# Altium footprint library ICs And Semiconductors THD.PcbLib: 507 footprints (part 28 of 32)
Each footprint in its own frame and in the unit in brackets; x right, y up, seen from the top. Pads: shape width x height; smd on the part's side, far side on the other; paste and mask are expansions set on the pad; w line width, h text height; cw(c..) or ccw(c..) is an arc to the next point about the centre after c.
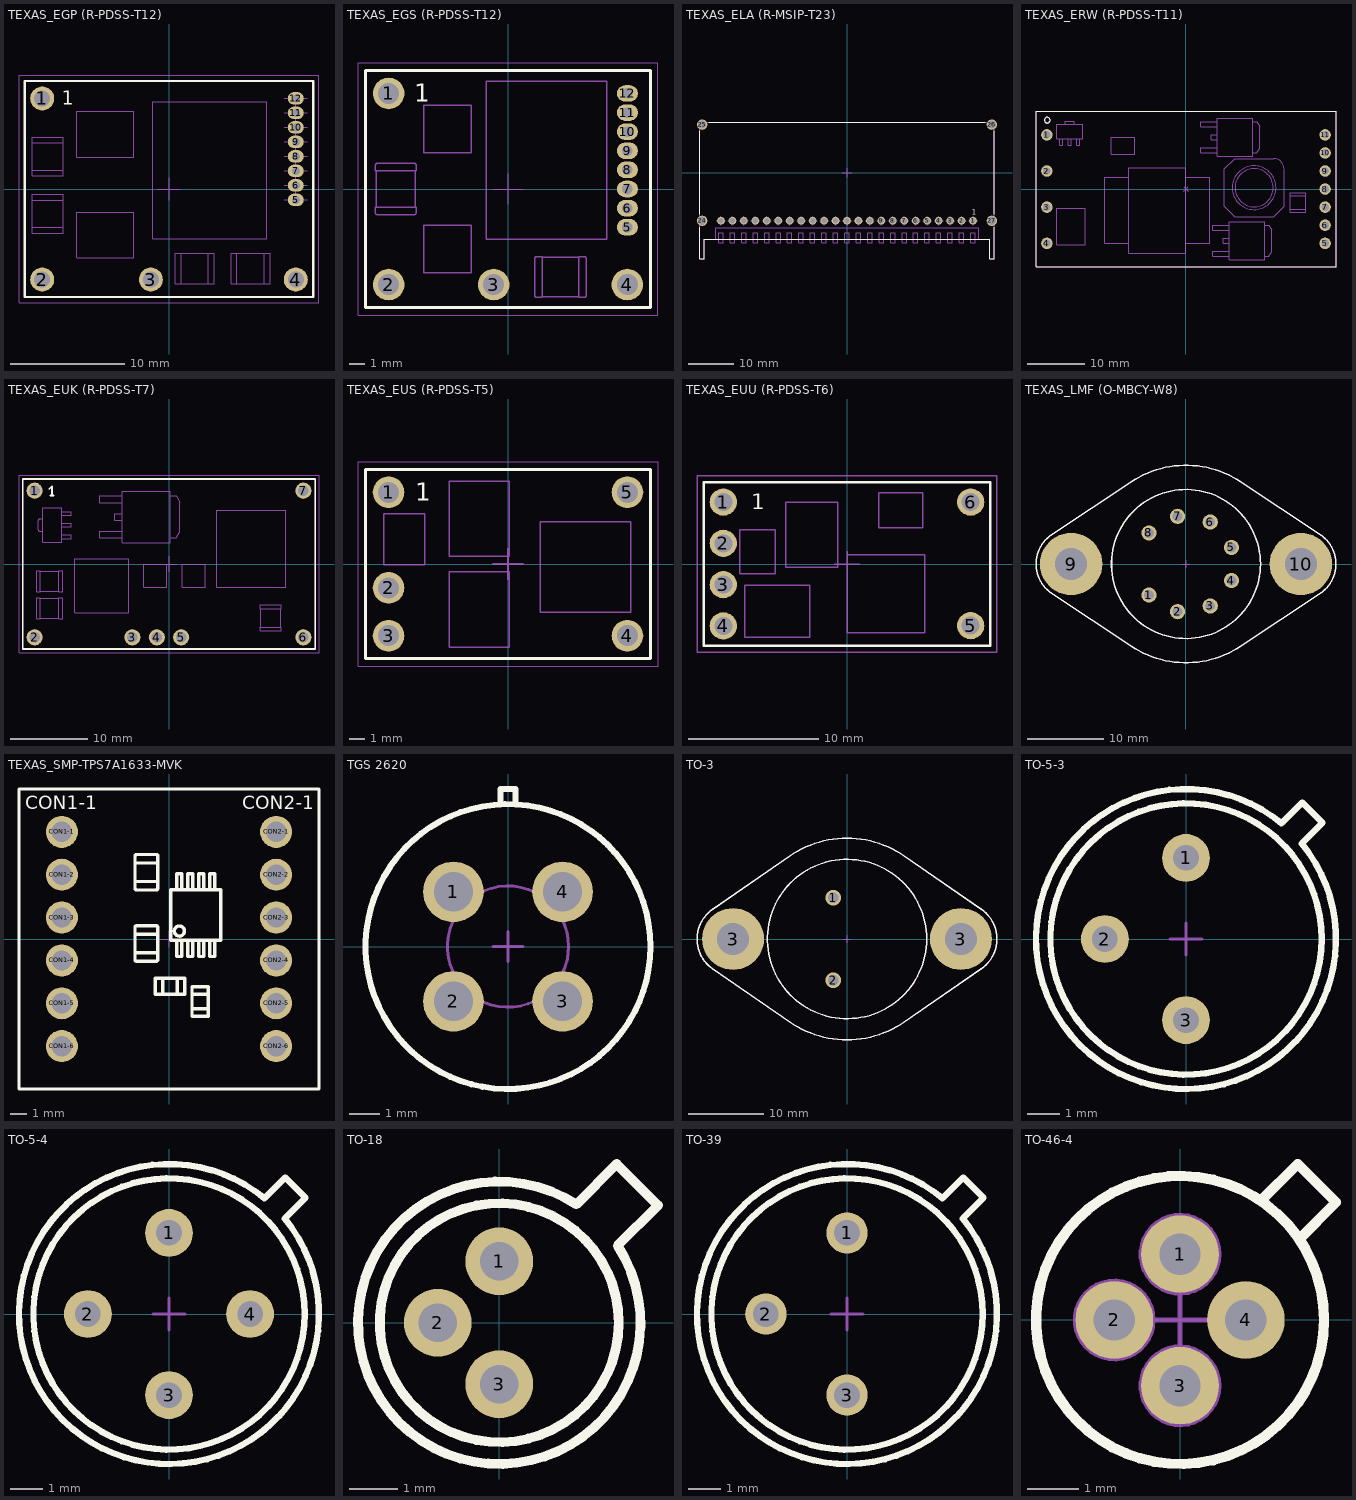
[diagram p27: the footprints below, top view; thin cyan lines are the x and y axes]

## TEXAS_EGP (R-PDSS-T12) [mm] "Texas EGP (R-PDSS-T12) Case"
height 9.65
pads (12):
  round 2.1 hole 1.4: 1(-11.11,7.94) 2(-11.11,-7.94) 3(-1.59,-7.94) 4(11.11,-7.94)
  oval 1.4x1.1 hole 0.7: 5(11.11,-0.95) 6(11.11,0.32) 7(11.11,1.59) 8(11.11,2.86) 9(11.11,4.13) 10(11.11,5.4) 11(11.11,6.67) 12(11.11,7.94)
Top Overlay:
  lines w0.2: -12.635,-9.46 -12.635,9.46 12.635,9.46 12.635,-9.46 -12.635,-9.46
  text "1" at -9.391,7.392 h1.2
Notvisible:
  lines w0.1: -12.11,-7.94 -11.11,-7.94 ; -12.11,7.94 -11.11,7.94 ; -11.11,-8.94 -11.11,-7.94 ; -11.11,-6.94 -11.11,-7.94 ; -11.11,6.94 -11.11,7.94 ; -11.11,8.94 -11.11,7.94 ; -10.11,-7.94 -11.11,-7.94 ; -10.11,7.94 -11.11,7.94 ; -2.59,-7.94 -1.59,-7.94 ; -1.59,-8.94 -1.59,-7.94 ; -1.59,-6.94 -1.59,-7.94 ; -1,0 0,0 ; -0.59,-7.94 -1.59,-7.94 ; 0,-1 0,0 ; 0,1 0,0 ; 1,0 0,0 ; 10.11,-7.94 11.11,-7.94 ; 10.11,-0.95 11.11,-0.95 ; 10.11,0.32 11.11,0.32 12.11,0.32 ; 10.11,1.59 11.11,1.59 12.11,1.59 ; 10.11,2.86 11.11,2.86 12.11,2.86 ; 10.11,4.13 11.11,4.13 12.11,4.13 ; 10.11,5.4 11.11,5.4 12.11,5.4 ; 10.11,6.67 11.11,6.67 12.11,6.67 ; 10.11,7.94 11.11,7.94 ; 11.11,-8.94 11.11,-7.94 ; 11.11,-6.94 11.11,-7.94 ; 12.11,-7.94 11.11,-7.94 ; 12.11,-0.95 11.11,-0.95 ; 12.11,7.94 11.11,7.94 ; 11.11,-0.95 11.11,7.94
Mechanical 14:
  lines w0.1: -11.987,-3.37 -9.287,-3.37 ; -11.987,-0.97 -9.287,-0.97 ; -11.987,1.648 -9.287,1.648 ; -11.987,4.048 -9.287,4.048 ; 1.053,-8.309 1.053,-5.609 ; 3.453,-8.309 3.453,-5.609 ; 5.957,-8.309 5.957,-5.609 ; 8.357,-8.309 8.357,-5.609 ; -12.635,-9.46 -12.635,9.46 12.635,9.46 12.635,-9.46 -12.635,-9.46 ; -11.987,-3.87 -11.987,-0.47 -9.287,-0.47 -9.287,-3.87 -11.987,-3.87 ; -11.987,1.148 -11.987,4.548 -9.287,4.548 -9.287,1.148 -11.987,1.148 ; -8.076,-6.046 -8.076,-2.046 -3.076,-2.046 -3.076,-6.046 -8.076,-6.046 ; -8.076,2.804 -8.076,6.804 -3.076,6.804 -3.076,2.804 -8.076,2.804 ; -1.431,-4.339 8.569,-4.339 8.569,7.661 -1.431,7.661 -1.431,-4.339 ; 0.553,-8.309 0.553,-5.609 3.953,-5.609 3.953,-8.309 0.553,-8.309 ; 5.457,-8.309 5.457,-5.609 8.857,-5.609 8.857,-8.309 5.457,-8.309
  text "1" at -9.391,7.392 h1.2
Mechanical 15:
  lines w0.1: -13.145,-9.97 13.145,-9.97 13.145,9.97 -13.145,9.97 -13.145,-9.97
3D body "TEXAS_EGP (R-PDSS-T12).stp": height 9.65, standoff -3.55, extent -12.635,-9.46 12.635,9.46

## TEXAS_EGS (R-PDSS-T12) [mm] "Texas EGS (R-PDSS-T12) Case"
height 8
pads (12):
  round 2.1 hole 1.4: 1(-7.935,6.35) 2(-7.935,-6.35) 3(-0.955,-6.35) 4(7.935,-6.35)
  oval 1.4x1.1 hole 0.7: 5(7.935,-2.54) 6(7.935,-1.27) 7(7.935,0) 8(7.935,1.27) 9(7.935,2.54) 10(7.935,3.81) 11(7.935,5.08) 12(7.935,6.35)
Top Overlay:
  lines w0.2: -9.46,-7.875 9.46,-7.875 9.46,7.875 -9.46,7.875 -9.46,-7.875
  text "1" at -6.216,5.802 h1.2
Notvisible:
  lines w0.05: -8.435,-6.35 -7.935,-6.35 ; -8.435,6.35 -7.935,6.35 ; -7.935,-6.85 -7.935,-6.35 ; -7.935,-5.85 -7.935,-6.35 ; -7.935,5.85 -7.935,6.35 ; -7.935,6.85 -7.935,6.35 ; -7.435,-6.35 -7.935,-6.35 ; -7.435,6.35 -7.935,6.35 ; -1.455,-6.35 -0.955,-6.35 ; -1,0 0,0 ; -0.955,-6.85 -0.955,-6.35 ; -0.955,-5.85 -0.955,-6.35 ; -0.455,-6.35 -0.955,-6.35 ; 0,-1 0,0 ; 0,1 0,0 ; 1,0 0,0 ; 7.435,-6.35 7.935,-6.35 ; 7.435,-2.54 7.935,-2.54 ; 7.435,-1.27 7.935,-1.27 ; 7.435,0 7.935,0 ; 7.435,1.27 7.935,1.27 ; 7.435,2.54 7.935,2.54 ; 7.435,3.81 7.935,3.81 ; 7.435,5.08 7.935,5.08 ; 7.435,6.35 7.935,6.35 ; 7.935,-6.85 7.935,-6.35 ; 7.935,-5.85 7.935,-6.35 ; 7.935,-3.04 7.935,-2.54 ; 7.935,-2.04 7.935,-2.54 ; 7.935,-1.77 7.935,-1.27 ; 7.935,-0.77 7.935,-1.27 ; 7.935,-0.5 7.935,0 ; 7.935,0.5 7.935,0 ; 7.935,0.77 7.935,1.27 ; 7.935,1.77 7.935,1.27 ; 7.935,2.04 7.935,2.54 ; 7.935,3.04 7.935,2.54 ; 7.935,3.31 7.935,3.81 ; 7.935,4.31 7.935,3.81 ; 7.935,4.58 7.935,5.08 ; 7.935,5.58 7.935,5.08 ; 7.935,5.85 7.935,6.35 ; 7.935,6.85 7.935,6.35 ; 8.435,-6.35 7.935,-6.35 ; 8.435,-2.54 7.935,-2.54 ; 8.435,-1.27 7.935,-1.27 ; 8.435,0 7.935,0 ; 8.435,1.27 7.935,1.27 ; 8.435,2.54 7.935,2.54 ; 8.435,3.81 7.935,3.81 ; 8.435,5.08 7.935,5.08 ; 8.435,6.35 7.935,6.35
Mechanical 14:
  circle w0.1: c7.935,6.35 r0.45
  circle w0.1: c7.935,5.08 r0.45
  circle w0.1: c7.935,3.81 r0.45
  circle w0.1: c7.935,2.54 r0.45
  circle w0.1: c7.935,1.27 r0.45
  circle w0.1: c7.935,0 r0.45
  circle w0.1: c7.935,-1.27 r0.45
  circle w0.1: c7.935,-2.54 r0.45
  circle w0.1: c-7.935,6.35 r0.89
  circle w0.1: c-7.935,-6.35 r0.89
  circle w0.1: c-0.955,-6.35 r0.89
  circle w0.1: c7.935,-6.35 r0.89
  lines w0.1: -8.76,-1.2 -8.76,1.2 ; -6.16,-1.2 -6.16,1.2 ; 2.29,-7.15 4.69,-7.15 ; 2.29,-4.55 4.69,-4.55 ; -9.46,-7.875 9.46,-7.875 9.46,7.875 -9.46,7.875 -9.46,-7.875 ; -8.81,-1.6 ccw(c-8.71,-1.6) -8.71,-1.7 -6.21,-1.7 ccw(c-6.21,-1.6) -6.11,-1.6 -6.11,-1.2 -8.81,-1.2 -8.81,-1.6 ; -8.81,1.2 -6.11,1.2 -6.11,1.6 ccw(c-6.21,1.6) -6.21,1.7 -8.71,1.7 ccw(c-8.71,1.6) -8.81,1.6 -8.81,1.2 ; -5.586,-5.575 -5.586,-2.425 -2.436,-2.425 -2.436,-5.575 -5.586,-5.575 ; -5.586,2.425 -5.586,5.575 -2.436,5.575 -2.436,2.425 -5.586,2.425 ; -1.431,-3.339 6.569,-3.339 6.569,7.161 -1.431,7.161 -1.431,-3.339 ; 1.79,-7.1 ccw(c1.89,-7.1) 1.89,-7.2 2.29,-7.2 2.29,-4.5 1.89,-4.5 ccw(c1.89,-4.6) 1.79,-4.6 1.79,-7.1 ; 4.69,-7.2 4.69,-4.5 5.09,-4.5 cw(c5.09,-4.6) 5.19,-4.6 5.19,-7.1 cw(c5.09,-7.1) 5.09,-7.2 4.69,-7.2 ; 7.735,-2.74 7.735,-2.34 8.135,-2.34 8.135,-2.74 7.735,-2.74 ; 7.735,-1.47 7.735,-1.07 8.135,-1.07 8.135,-1.47 7.735,-1.47 ; 7.735,-0.2 7.735,0.2 8.135,0.2 8.135,-0.2 7.735,-0.2 ; 7.735,1.07 7.735,1.47 8.135,1.47 8.135,1.07 7.735,1.07 ; 7.735,2.34 7.735,2.74 8.135,2.74 8.135,2.34 7.735,2.34 ; 7.735,3.61 7.735,4.01 8.135,4.01 8.135,3.61 7.735,3.61 ; 7.735,4.88 7.735,5.28 8.135,5.28 8.135,4.88 7.735,4.88 ; 7.735,6.15 7.735,6.55 8.135,6.55 8.135,6.15 7.735,6.15
  text "1" at -6.216,5.802 h1.2
Mechanical 15:
  lines w0.05: -9.97,-8.38 9.97,-8.38 9.97,8.38 -9.97,8.38 -9.97,-8.38
3D body "TEXAS_EGS (R-PDSS-T12).stp": height 8, standoff -3.55, extent -9.46,-7.875 9.46,7.875

## TEXAS_ELA (R-MSIP-T23) [mm] "TEXAS (R-MSIP-T23) Case"
height 12.7
pads (27):
  round 1.7 hole 1.2: 1(27.94,-10.665) 2(25.4,-10.665) 3(22.86,-10.665) 4(20.32,-10.665) 5(17.78,-10.665) 6(15.24,-10.665) 7(12.7,-10.665) 8(10.16,-10.665) 9(7.62,-10.665) 10(5.08,-10.665) 11(2.54,-10.665) 12(0,-10.665) 13(-2.54,-10.665) 14(-5.08,-10.665) 15(-7.62,-10.665) 16(-10.16,-10.665) 17(-12.7,-10.665) 18(-15.24,-10.665) 19(-17.78,-10.665) 20(-20.32,-10.665) 21(-22.86,-10.665) 22(-25.4,-10.665) 23(-27.94,-10.665)
  round 2.3 hole 1.8: 24(-32.105,-10.665) 25(-32.105,10.665) 26(32.105,10.665) 27(32.105,-10.665)
Top Overlay:
  lines w0.2: -32.605,-12.079 -32.605,-19.055 -31.605,-19.055 -31.605,-14.735 31.605,-14.735 31.605,-19.055 32.605,-19.055 32.605,-12.079 ; -32.605,-9.251 -32.605,9.251 ; -30.691,11.165 30.691,11.165 ; 32.605,-9.251 32.605,9.251
  text "1" at 27.684,-9.323 h1.2
Notvisible:
  lines w0.1: -33.105,-10.665 -32.105,-10.665 ; -33.105,10.665 -32.105,10.665 ; -32.105,-11.665 -32.105,-10.665 ; -32.105,-9.665 -32.105,-10.665 ; -32.105,9.665 -32.105,10.665 ; -32.105,11.665 -32.105,10.665 ; -31.105,-10.665 -32.105,-10.665 ; -31.105,10.665 -32.105,10.665 ; -28.94,-10.665 -27.94,-10.665 ; -27.94,-11.665 -27.94,-10.665 ; -27.94,-9.665 -27.94,-10.665 ; -26.94,-10.665 -27.94,-10.665 ; -26.4,-10.665 -25.4,-10.665 ; -25.4,-11.665 -25.4,-10.665 ; -25.4,-9.665 -25.4,-10.665 ; -24.4,-10.665 -25.4,-10.665 ; -23.86,-10.665 -22.86,-10.665 ; -22.86,-11.665 -22.86,-10.665 ; -22.86,-9.665 -22.86,-10.665 ; -21.86,-10.665 -22.86,-10.665 ; -21.32,-10.665 -20.32,-10.665 ; -20.32,-11.665 -20.32,-10.665 ; -20.32,-9.665 -20.32,-10.665 ; -19.32,-10.665 -20.32,-10.665 ; -18.78,-10.665 -17.78,-10.665 ; -17.78,-11.665 -17.78,-10.665 ; -17.78,-9.665 -17.78,-10.665 ; -16.78,-10.665 -17.78,-10.665 ; -16.24,-10.665 -15.24,-10.665 ; -15.24,-11.665 -15.24,-10.665 ; -15.24,-9.665 -15.24,-10.665 ; -14.24,-10.665 -15.24,-10.665 ; -13.7,-10.665 -12.7,-10.665 ; -12.7,-11.665 -12.7,-10.665 ; -12.7,-9.665 -12.7,-10.665 ; -11.7,-10.665 -12.7,-10.665 ; -11.16,-10.665 -10.16,-10.665 ; -10.16,-11.665 -10.16,-10.665 ; -10.16,-9.665 -10.16,-10.665 ; -9.16,-10.665 -10.16,-10.665 ; -8.62,-10.665 -7.62,-10.665 ; -7.62,-11.665 -7.62,-10.665 ; -7.62,-9.665 -7.62,-10.665 ; -6.62,-10.665 -7.62,-10.665 ; -6.08,-10.665 -5.08,-10.665 ; -5.08,-11.665 -5.08,-10.665 ; -5.08,-9.665 -5.08,-10.665 ; -4.08,-10.665 -5.08,-10.665 ; -3.54,-10.665 -2.54,-10.665 ; -2.54,-11.665 -2.54,-10.665 ; -2.54,-9.665 -2.54,-10.665 ; -1.54,-10.665 -2.54,-10.665 ; -1,-10.665 0,-10.665 ; -1,0 0,0 ; 0,-11.665 0,-10.665 ; 0,-9.665 0,-10.665 ; 0,-1 0,0 ; 0,1 0,0 ; 1,-10.665 0,-10.665 ; 1,0 0,0 ; 1.54,-10.665 2.54,-10.665 ; 2.54,-11.665 2.54,-10.665 ; 2.54,-9.665 2.54,-10.665 ; 3.54,-10.665 2.54,-10.665 ; 4.08,-10.665 5.08,-10.665 ; 5.08,-11.665 5.08,-10.665 ; 5.08,-9.665 5.08,-10.665 ; 6.08,-10.665 5.08,-10.665 ; 6.62,-10.665 7.62,-10.665 ; 7.62,-11.665 7.62,-10.665 ; 7.62,-9.665 7.62,-10.665 ; 8.62,-10.665 7.62,-10.665 ; 9.16,-10.665 10.16,-10.665 ; 10.16,-11.665 10.16,-10.665 ; 10.16,-9.665 10.16,-10.665 ; 11.16,-10.665 10.16,-10.665 ; 11.7,-10.665 12.7,-10.665 ; 12.7,-11.665 12.7,-10.665 ; 12.7,-9.665 12.7,-10.665 ; 13.7,-10.665 12.7,-10.665 ; 14.24,-10.665 15.24,-10.665 ; 15.24,-11.665 15.24,-10.665 ; 15.24,-9.665 15.24,-10.665 ; 16.24,-10.665 15.24,-10.665 ; 16.78,-10.665 17.78,-10.665 ; 17.78,-11.665 17.78,-10.665 ; 17.78,-9.665 17.78,-10.665 ; 18.78,-10.665 17.78,-10.665 ; 19.32,-10.665 20.32,-10.665 ; 20.32,-11.665 20.32,-10.665 ; 20.32,-9.665 20.32,-10.665 ; 21.32,-10.665 20.32,-10.665 ; 21.86,-10.665 22.86,-10.665 ; 22.86,-11.665 22.86,-10.665 ; 22.86,-9.665 22.86,-10.665 ; 23.86,-10.665 22.86,-10.665 ; 24.4,-10.665 25.4,-10.665 ; 25.4,-11.665 25.4,-10.665 ; 25.4,-9.665 25.4,-10.665 ; 26.4,-10.665 25.4,-10.665 ; 26.94,-10.665 27.94,-10.665 ; 27.94,-11.665 27.94,-10.665 ; 27.94,-9.665 27.94,-10.665 ; 28.94,-10.665 27.94,-10.665 ; 31.105,-10.665 32.105,-10.665 ; 31.105,10.665 32.105,10.665 ; 32.105,-11.665 32.105,-10.665 ; 32.105,-9.665 32.105,-10.665 ; 32.105,9.665 32.105,10.665 ; 32.105,11.665 32.105,10.665 ; 33.105,-10.665 32.105,-10.665 ; 33.105,10.665 32.105,10.665
Mechanical 14:
  lines w0.1: -29.105,-14.735 -29.105,-12.235 29.105,-12.235 29.105,-14.735 ; -28.44,-14.735 -31.605,-14.735 -31.605,-19.055 -32.605,-19.055 -32.605,11.165 32.605,11.165 32.605,-19.055 31.605,-19.055 31.605,-14.735 28.44,-14.735 ; -27.44,-14.735 -25.9,-14.735 ; -24.9,-14.735 -23.36,-14.735 ; -22.36,-14.735 -20.82,-14.735 ; -19.82,-14.735 -18.28,-14.735 ; -17.28,-14.735 -15.74,-14.735 ; -14.74,-14.735 -13.2,-14.735 ; -12.2,-14.735 -10.66,-14.735 ; -9.66,-14.735 -8.12,-14.735 ; -7.12,-14.735 -5.58,-14.735 ; -4.58,-14.735 -3.04,-14.735 ; -2.04,-14.735 -0.5,-14.735 ; 0.5,-14.735 2.04,-14.735 ; 3.04,-14.735 4.58,-14.735 ; 5.58,-14.735 7.12,-14.735 ; 8.12,-14.735 9.66,-14.735 ; 10.66,-14.735 12.2,-14.735 ; 13.2,-14.735 14.74,-14.735 ; 15.74,-14.735 17.28,-14.735 ; 18.28,-14.735 19.82,-14.735 ; 20.82,-14.735 22.36,-14.735 ; 23.36,-14.735 24.9,-14.735 ; 25.9,-14.735 27.44,-14.735 ; -28.44,-15.535 -28.44,-13.331 -27.44,-13.331 -27.44,-15.535 -28.44,-15.535 ; -25.9,-15.535 -25.9,-13.331 -24.9,-13.331 -24.9,-15.535 -25.9,-15.535 ; -23.36,-15.535 -23.36,-13.331 -22.36,-13.331 -22.36,-15.535 -23.36,-15.535 ; -20.82,-15.535 -20.82,-13.331 -19.82,-13.331 -19.82,-15.535 -20.82,-15.535 ; -18.28,-15.535 -18.28,-13.331 -17.28,-13.331 -17.28,-15.535 -18.28,-15.535 ; -15.74,-15.535 -15.74,-13.331 -14.74,-13.331 -14.74,-15.535 -15.74,-15.535 ; -13.2,-15.535 -13.2,-13.331 -12.2,-13.331 -12.2,-15.535 -13.2,-15.535 ; -10.66,-15.535 -10.66,-13.331 -9.66,-13.331 -9.66,-15.535 -10.66,-15.535 ; -8.12,-15.535 -8.12,-13.331 -7.12,-13.331 -7.12,-15.535 -8.12,-15.535 ; -5.58,-15.535 -5.58,-13.331 -4.58,-13.331 -4.58,-15.535 -5.58,-15.535 ; -3.04,-15.535 -3.04,-13.331 -2.04,-13.331 -2.04,-15.535 -3.04,-15.535 ; -0.5,-15.535 -0.5,-13.331 0.5,-13.331 0.5,-15.535 -0.5,-15.535 ; 2.04,-15.535 2.04,-13.331 3.04,-13.331 3.04,-15.535 2.04,-15.535 ; 4.58,-15.535 4.58,-13.331 5.58,-13.331 5.58,-15.535 4.58,-15.535 ; 7.12,-15.535 7.12,-13.331 8.12,-13.331 8.12,-15.535 7.12,-15.535 ; 9.66,-15.535 9.66,-13.331 10.66,-13.331 10.66,-15.535 9.66,-15.535 ; 12.2,-15.535 12.2,-13.331 13.2,-13.331 13.2,-15.535 12.2,-15.535 ; 14.74,-15.535 14.74,-13.331 15.74,-13.331 15.74,-15.535 14.74,-15.535 ; 17.28,-15.535 17.28,-13.331 18.28,-13.331 18.28,-15.535 17.28,-15.535 ; 19.82,-15.535 19.82,-13.331 20.82,-13.331 20.82,-15.535 19.82,-15.535 ; 22.36,-15.535 22.36,-13.331 23.36,-13.331 23.36,-15.535 22.36,-15.535 ; 24.9,-15.535 24.9,-13.331 25.9,-13.331 25.9,-15.535 24.9,-15.535 ; 27.44,-15.535 27.44,-13.331 28.44,-13.331 28.44,-15.535 27.44,-15.535
  text "1" at 27.684,-9.323 h1.2
3D body "TEXAS_ELA (R-MSIP-T23).stp": height 12.7, standoff -4, extent -32.605,-19.055 32.605,11.165

## TEXAS_ERW (R-PDSS-T11) [mm] "Texas ERW (R-PDSS-T11) Case, Body W 51.94 x L 26.54 x H9.98mm"
height 8.98
pads (11):
  round 2 hole 1.3: 1(-24.445,9.51) 2(-24.445,3.16) 3(-24.445,-3.19) 4(-24.445,-9.54) 5(24.445,-9.54) 6(24.445,-6.365) 7(24.445,-3.19) 8(24.445,-0.015) 9(24.445,3.16) 10(24.445,6.335) 11(24.445,9.51)
Top Overlay:
  circle w0.2: c-24.37,12.085 r0.5
  lines w0.2: -26.35,-13.65 -26.35,13.65 26.35,13.65 26.35,-13.65 -26.35,-13.65
Notvisible:
  lines w0.1: -24.945,-9.54 -24.445,-9.54 ; -24.945,-3.19 -24.445,-3.19 ; -24.945,3.16 -24.445,3.16 ; -24.945,9.51 -24.445,9.51 ; -24.445,-10.04 -24.445,-9.54 ; -24.445,-9.04 -24.445,-9.54 ; -24.445,-3.69 -24.445,-3.19 ; -24.445,-2.69 -24.445,-3.19 ; -24.445,2.66 -24.445,3.16 ; -24.445,3.66 -24.445,3.16 ; -24.445,9.01 -24.445,9.51 ; -24.445,10.01 -24.445,9.51 ; -23.945,-9.54 -24.445,-9.54 ; -23.945,-3.19 -24.445,-3.19 ; -23.945,3.16 -24.445,3.16 ; -23.945,9.51 -24.445,9.51 ; -0.354,-0.354 0,0 ; -0.354,0.354 0,0 ; 0.354,-0.354 0,0 ; 0.354,0.354 0,0 ; 23.945,-9.54 24.445,-9.54 ; 23.945,-6.365 24.445,-6.365 ; 23.945,-3.19 24.445,-3.19 ; 23.945,-0.015 24.445,-0.015 ; 23.945,3.16 24.445,3.16 ; 23.945,6.335 24.445,6.335 ; 23.945,9.51 24.445,9.51 ; 24.445,-10.04 24.445,-9.54 ; 24.445,-9.04 24.445,-9.54 ; 24.445,-6.865 24.445,-6.365 ; 24.445,-5.865 24.445,-6.365 ; 24.445,-3.69 24.445,-3.19 ; 24.445,-2.69 24.445,-3.19 ; 24.445,-0.515 24.445,-0.015 ; 24.445,0.485 24.445,-0.015 ; 24.445,2.66 24.445,3.16 ; 24.445,3.66 24.445,3.16 ; 24.445,5.835 24.445,6.335 ; 24.445,6.835 24.445,6.335 ; 24.445,9.01 24.445,9.51 ; 24.445,10.01 24.445,9.51 ; 24.945,-9.54 24.445,-9.54 ; 24.945,-6.365 24.445,-6.365 ; 24.945,-3.19 24.445,-3.19 ; 24.945,-0.015 24.445,-0.015 ; 24.945,3.16 24.445,3.16 ; 24.945,6.335 24.445,6.335 ; 24.945,9.51 24.445,9.51
Mechanical 14:
  circle w0.1: c24.445,9.51 r0.85
  circle w0.1: c24.445,6.335 r0.85
  circle w0.1: c24.445,3.16 r0.85
  circle w0.1: c24.445,-0.015 r0.85
  circle w0.1: c24.445,-3.19 r0.85
  circle w0.1: c24.445,-6.365 r0.85
  circle w0.1: c24.445,-9.54 r0.85
  circle w0.1: c-24.445,-9.54 r0.85
  circle w0.1: c-24.445,-3.19 r0.85
  circle w0.1: c-24.445,3.16 r0.85
  circle w0.1: c-24.445,9.51 r0.85
  circle w0.1: c11.97,0.23 r3.85
  circle w0.1: c11.97,0.23 r3.35
  circle w0.1: c-24.37,12.085 r0.5
  lines w0.1: -22.16,8.861 -22.16,7.67 -21.68,7.67 -21.68,8.87 ; -21.22,11.35 -21.22,11.92 -19.62,11.92 -19.62,11.353 ; -20.66,8.861 -20.66,7.67 -20.18,7.67 -20.18,8.861 ; -19.16,8.87 -19.16,7.67 -18.68,7.67 -18.68,8.87 ; -10.03,-9.57 -14.23,-9.57 -14.23,2.03 -10.03,2.03 ; -0.03,-9.57 4.17,-9.57 4.17,2.03 -0.03,2.03 ; 5.47,6.38 2.564,6.38 2.564,7.27 5.47,7.27 ; 5.47,8.66 4.47,8.66 4.47,9.55 5.47,9.55 ; 5.47,10.94 2.564,10.94 2.564,11.83 5.47,11.83 ; 7.57,-11.83 4.664,-11.83 4.664,-10.94 7.57,-10.94 ; 7.57,-9.55 6.57,-9.55 6.57,-8.66 7.57,-8.66 ; 7.57,-7.27 4.664,-7.27 4.664,-6.38 7.57,-6.38 ; 11.69,6.375 12.46,6.375 12.96,7.175 12.96,11.035 12.46,11.835 11.69,11.835 ; 13.79,-11.835 14.56,-11.835 15.06,-11.035 15.06,-7.175 14.56,-6.375 13.79,-6.375 ; 18.299,-3.559 20.999,-3.559 ; 18.299,-1.159 20.999,-1.159 ; -26.35,-13.65 -26.35,13.65 26.35,13.65 26.35,-13.65 -26.35,-13.65 ; -22.67,-9.77 -22.67,-3.37 -17.67,-3.37 -17.67,-9.77 -22.67,-9.77 ; -22.67,8.87 -22.67,11.35 -18.17,11.35 -18.17,8.87 -22.67,8.87 ; -13.17,6.07 -13.17,9.07 -8.97,9.07 -8.97,6.07 -13.17,6.07 ; -10.03,-11.27 -0.03,-11.27 -0.03,3.73 -10.03,3.73 -10.03,-11.27 ; 5.47,5.74 5.47,12.47 11.69,12.47 11.69,5.74 5.47,5.74 ; 6.72,-3.07 6.72,3.53 8.52,5.33 15.42,5.33 cw(c15.42,3.53) 17.22,3.53 17.22,-3.07 15.42,-4.87 8.52,-4.87 6.72,-3.07 ; 7.57,-12.47 7.57,-5.74 13.79,-5.74 13.79,-12.47 7.57,-12.47 ; 18.299,-4.059 20.999,-4.059 20.999,-0.659 18.299,-0.659 18.299,-4.059
3D body "TEXAS_ERW (R-PDSS-T11).stp": height 9.98, standoff -3.55, extent -26.35,-13.65 26.35,13.65

## TEXAS_EUK (R-PDSS-T7) [mm] "Texas EUK (R-PDSS-T7) Case, Body W 22.1 x L 37.97 x H9mm"
height 9
pads (7):
  round 2.1 hole 1.4: 1(-17.463,9.525) 2(-17.463,-9.525) 3(-4.763,-9.525) 4(-1.587,-9.525) 5(1.587,-9.525) 6(17.463,-9.525) 7(17.463,9.525)
Top Overlay:
  lines w0.2: -15.558,9.749 -15.205,10.102 -15.205,8.902 ; -15.455,8.902 -14.955,8.902 ; -18.985,-11.049 -18.985,11.049 18.985,11.049 18.985,-11.049 -18.985,-11.049
Notvisible:
  lines w0.1: -18.463,-9.525 -17.463,-9.525 ; -18.463,9.525 -17.463,9.525 ; -17.463,-10.525 -17.463,-9.525 ; -17.463,-8.525 -17.463,-9.525 ; -17.463,8.525 -17.463,9.525 ; -17.463,10.525 -17.463,9.525 ; -16.463,-9.525 -17.463,-9.525 ; -16.463,9.525 -17.463,9.525 ; -5.763,-9.525 -4.763,-9.525 ; -4.763,-10.525 -4.763,-9.525 ; -4.763,-8.525 -4.763,-9.525 ; -3.763,-9.525 -4.763,-9.525 ; -2.588,-9.525 -1.587,-9.525 ; -1.587,-10.525 -1.587,-9.525 ; -1.587,-8.525 -1.587,-9.525 ; -1,0 0,0 ; -0.587,-9.525 -1.587,-9.525 ; 0,-1 0,0 ; 0,1 0,0 ; 0.587,-9.525 1.587,-9.525 ; 1,0 0,0 ; 1.587,-10.525 1.587,-9.525 ; 1.587,-8.525 1.587,-9.525 ; 2.588,-9.525 1.587,-9.525 ; 16.463,-9.525 17.463,-9.525 ; 16.463,9.525 17.463,9.525 ; 17.463,-10.525 17.463,-9.525 ; 17.463,-8.525 17.463,-9.525 ; 17.463,8.525 17.463,9.525 ; 17.463,10.525 17.463,9.525 ; 18.463,-9.525 17.463,-9.525 ; 18.463,9.525 17.463,9.525
Mechanical 14:
  circle w0.1: c-17.463,9.525 r0.89
  circle w0.1: c17.463,9.525 r0.89
  circle w0.1: c17.463,-9.525 r0.89
  circle w0.1: c1.587,-9.525 r0.89
  circle w0.1: c-1.587,-9.525 r0.89
  circle w0.1: c-4.763,-9.525 r0.89
  circle w0.1: c-17.463,-9.525 r0.89
  lines w0.1: -16.715,-7.05 -14.315,-7.05 ; -16.715,-4.45 -14.315,-4.45 ; -16.715,-3.55 -14.315,-3.55 ; -16.715,-0.95 -14.315,-0.95 ; -16.415,4.249 -16.785,4.249 cw(c-16.785,4.449) -16.985,4.449 -16.985,5.649 cw(c-16.785,5.649) -16.785,5.849 -16.415,5.849 ; -15.558,9.749 -15.205,10.102 -15.205,8.902 ; -15.455,8.902 -14.955,8.902 ; -13.969,5.289 -12.735,5.289 -12.735,4.809 -13.926,4.809 ; -13.935,6.309 -12.735,6.309 -12.735,6.789 -13.935,6.789 ; -13.926,3.309 -12.735,3.309 -12.735,3.789 -13.926,3.789 ; -6.079,3.391 -9.009,3.391 -9.009,4.281 -6.079,4.281 ; -6.079,5.671 -7.079,5.671 -7.079,6.561 -6.079,6.561 ; -6.079,7.951 -9.009,7.951 -9.009,8.841 -6.079,8.841 ; 0.141,3.386 0.911,3.386 1.411,4.186 1.411,8.046 0.911,8.846 0.141,8.846 ; 11.935,-8.2 11.935,-5.8 ; 14.535,-8.2 14.535,-5.8 ; -18.985,-11.049 -18.985,11.049 18.985,11.049 18.985,-11.049 -18.985,-11.049 ; -17.215,-7.1 -16.715,-7.1 -16.715,-4.4 -17.215,-4.4 -17.215,-7.1 ; -17.215,-3.6 -16.715,-3.6 -16.715,-0.9 -17.215,-0.9 -17.215,-3.6 ; -16.415,2.799 -16.415,7.299 -13.935,7.299 -13.935,2.799 -16.415,2.799 ; -14.315,-7.1 -13.815,-7.1 -13.815,-4.4 -14.315,-4.4 -14.315,-7.1 ; -14.315,-3.6 -13.815,-3.6 -13.815,-0.9 -14.315,-0.9 -14.315,-3.6 ; -12.246,-6.335 -12.246,0.665 -5.246,0.665 -5.246,-6.335 -12.246,-6.335 ; -6.079,2.751 0.141,2.751 0.141,9.481 -6.079,9.481 -6.079,2.751 ; -3.31,-3 -3.31,0 -0.31,0 -0.31,-3 -3.31,-3 ; 1.69,-3 1.69,0 4.69,0 4.69,-3 1.69,-3 ; 6.185,-3 6.185,7 15.185,7 15.185,-3 6.185,-3 ; 11.885,-8.7 14.585,-8.7 14.585,-8.2 11.885,-8.2 11.885,-8.7 ; 11.885,-5.8 11.885,-5.3 14.585,-5.3 14.585,-5.8 11.885,-5.8
Mechanical 15:
  lines w0.05: -19.495,-11.555 -19.495,11.555 19.495,11.555 19.495,-11.555 -19.495,-11.555
3D body "TEXAS_EUK (R-PDSS-T7).stp": height 8.97, standoff -3.55, extent -18.985,-11.049 18.985,11.049

## TEXAS_EUS (R-PDSS-T5) [mm] "Texas EUS (R-PDSS-T5) Case"
height 8.5
pads (5):
  round 2.1 hole 1.4: 1(-7.94,4.765) 2(-7.94,-1.585) 3(-7.94,-4.765) 4(7.94,-4.765) 5(7.94,4.765)
Top Overlay:
  lines w0.2: -9.46,-6.285 9.46,-6.285 9.46,6.285 -9.46,6.285 -9.46,-6.285
  text "1" at -6.166,4.217 h1.2
Notvisible:
  lines w0.1: -8.94,-4.765 -7.94,-4.765 ; -8.94,-1.585 -7.94,-1.585 ; -8.94,4.765 -7.94,4.765 ; -7.94,-5.765 -7.94,-4.765 ; -7.94,-3.765 -7.94,-4.765 ; -7.94,-2.585 -7.94,-1.585 ; -7.94,-0.585 -7.94,-1.585 ; -7.94,3.765 -7.94,4.765 ; -7.94,5.765 -7.94,4.765 ; -6.94,-4.765 -7.94,-4.765 ; -6.94,-1.585 -7.94,-1.585 ; -6.94,4.765 -7.94,4.765 ; -1,0 0,0 ; 0,-1 0,0 ; 0,1 0,0 ; 1,0 0,0 ; 6.94,-4.765 7.94,-4.765 ; 6.94,4.765 7.94,4.765 ; 7.94,-5.765 7.94,-4.765 ; 7.94,-3.765 7.94,-4.765 ; 7.94,3.765 7.94,4.765 ; 7.94,5.765 7.94,4.765 ; 8.94,-4.765 7.94,-4.765 ; 8.94,4.765 7.94,4.765
Mechanical 14:
  lines w0.1: -9.46,-6.285 -9.46,6.285 9.46,6.285 9.46,-6.285 -9.46,-6.285 ; -8.247,-0.059 -8.247,3.341 -5.547,3.341 -5.547,-0.059 -8.247,-0.059 ; -3.912,-5.523 -3.912,-0.523 0.088,-0.523 0.088,-5.523 -3.912,-5.523 ; -3.912,0.502 -3.912,5.502 0.088,5.502 0.088,0.502 -3.912,0.502 ; 2.154,-3.194 2.154,2.806 8.154,2.806 8.154,-3.194 2.154,-3.194
  text "1" at -6.166,4.217 h1.2
Mechanical 15:
  lines w0.05: -9.97,-6.795 -9.97,6.795 9.97,6.795 9.97,-6.795 -9.97,-6.795
3D body "TEXAS_EUS (R-PDSS-T5).stp": height 8.5, standoff -3.55, extent -9.46,-6.285 9.46,6.285

## TEXAS_EUU (R-PDSS-T6) [mm] "Texas TEXAS_EUU (R-PDSS-T6) Case"
height 8.5
pads (6):
  round 2.1 hole 1.4: 1(-9.53,4.77) 2(-9.53,1.59) 3(-9.53,-1.59) 4(-9.53,-4.77) 5(9.53,-4.75) 6(9.53,4.77)
Top Overlay:
  lines w0.2: -11.05,-6.285 -11.05,6.285 11.05,6.285 11.05,-6.285 -11.05,-6.285
  text "1" at -7.366,4.202 h1.2
Notvisible:
  lines w0.1: -10.53,-4.77 -9.53,-4.77 ; -10.53,-1.59 -9.53,-1.59 ; -10.53,1.59 -9.53,1.59 ; -10.53,4.77 -9.53,4.77 ; -9.53,-5.77 -9.53,-4.77 ; -9.53,-3.77 -9.53,-4.77 ; -9.53,-2.59 -9.53,-1.59 ; -9.53,-0.59 -9.53,-1.59 ; -9.53,0.59 -9.53,1.59 ; -9.53,2.59 -9.53,1.59 ; -9.53,3.77 -9.53,4.77 ; -9.53,5.77 -9.53,4.77 ; -8.53,-4.77 -9.53,-4.77 ; -8.53,-1.59 -9.53,-1.59 ; -8.53,1.59 -9.53,1.59 ; -8.53,4.77 -9.53,4.77 ; -1,0 0,0 ; 0,-1 0,0 ; 0,1 0,0 ; 1,0 0,0 ; 8.53,-4.75 9.53,-4.75 ; 8.53,4.77 9.53,4.77 ; 9.53,-5.75 9.53,-4.75 ; 9.53,-3.75 9.53,-4.75 ; 9.53,3.77 9.53,4.77 ; 9.53,5.77 9.53,4.77 ; 10.53,-4.75 9.53,-4.75 ; 10.53,4.77 9.53,4.77
Mechanical 14:
  lines w0.1: -11.05,-6.285 -11.05,6.285 11.05,6.285 11.05,-6.285 -11.05,-6.285 ; -8.247,-0.77 -5.547,-0.77 -5.547,2.63 -8.247,2.63 -8.247,-0.77 ; -7.867,-5.631 -2.867,-5.631 -2.867,-1.631 -7.867,-1.631 -7.867,-5.631 ; -4.715,-0.254 -0.715,-0.254 -0.715,4.746 -4.715,4.746 -4.715,-0.254 ; 0,-5.285 6,-5.285 6,0.715 0,0.715 0,-5.285 ; 2.45,2.799 2.45,5.499 5.85,5.499 5.85,2.799 2.45,2.799
  text "1" at -7.366,4.202 h1.2
Mechanical 15:
  lines w0.1: -11.56,-6.795 -11.56,6.795 11.56,6.795 11.56,-6.795 -11.56,-6.795
3D body "TEXAS_EUU (R-PDSS-T6).stp": height 8.5, standoff -3.55, extent -11.05,-6.285 11.05,6.285

## TEXAS_LMF (O-MBCY-W8) [mm] "TO-3 8 Pins, Texas LMF (O-MBCY-W8) Case"
height 7.62
pads (10):
  round 2 hole 1.3: 1(-4.864,-4.082) 2(-1.103,-6.254) 3(3.175,-5.499) 4(5.967,-2.172) 5(5.967,2.172) 6(3.175,5.499) 7(-1.103,6.254) 8(-4.864,4.082)
  round 8.2 hole 4.2: 9(-15.075,0) 10(15.075,0)
Top Overlay:
  circle w0.2: c0,0 r9.78
  lines w0.2: -17.627,-3.839 cw(c-15.075,0) -17.627,3.839 -7.171,10.789 cw(c0,0) 7.171,10.789 17.627,3.839 cw(c15.075,0) 17.627,-3.839 7.171,-10.789 cw(c0,0) -7.171,-10.789 -17.627,-3.839
Notvisible:
  lines w0.1: -15.575,0 -15.075,0 ; -15.075,-0.5 -15.075,0 ; -15.075,0.5 -15.075,0 ; -14.575,0 -15.075,0 ; -5.247,-4.403 -4.864,-4.082 ; -5.247,4.403 -4.864,4.082 ; -5.186,-3.699 -4.864,-4.082 ; -5.186,3.699 -4.864,4.082 ; -4.543,-4.465 -4.864,-4.082 ; -4.543,4.465 -4.864,4.082 ; -4.481,-3.76 -4.864,-4.082 ; -4.481,3.76 -4.864,4.082 ; -1.595,-6.167 -1.103,-6.254 ; -1.595,6.167 -1.103,6.254 ; -1.189,-6.746 -1.103,-6.254 ; -1.189,6.746 -1.103,6.254 ; -1.016,-5.761 -1.103,-6.254 ; -1.016,5.761 -1.103,6.254 ; -0.61,-6.34 -1.103,-6.254 ; -0.61,6.34 -1.103,6.254 ; -0.5,0 0,0 ; 0,-0.5 0,0 ; 0,0.5 0,0 ; 0.5,0 0,0 ; 2.742,-5.749 3.175,-5.499 ; 2.742,5.749 3.175,5.499 ; 2.925,-5.066 3.175,-5.499 ; 2.925,5.066 3.175,5.499 ; 3.425,-5.932 3.175,-5.499 ; 3.425,5.932 3.175,5.499 ; 3.608,-5.249 3.175,-5.499 ; 3.608,5.249 3.175,5.499 ; 5.497,-2.001 5.967,-2.172 ; 5.497,2.001 5.967,2.172 ; 5.796,-2.642 5.967,-2.172 ; 5.796,2.642 5.967,2.172 ; 6.138,-1.702 5.967,-2.172 ; 6.138,1.702 5.967,2.172 ; 6.437,-2.343 5.967,-2.172 ; 6.437,2.343 5.967,2.172 ; 14.575,0 15.075,0 ; 15.075,-0.5 15.075,0 ; 15.075,0.5 15.075,0 ; 15.575,0 15.075,0
Mechanical 14:
  circle w0.1: c-15.075,0 r1.95
  circle w0.1: c15.075,0 r1.95
  circle w0.1: c0,0 r9.78
  lines w0.1: -17.627,-3.839 cw(c-15.075,0) -17.627,3.839 -7.171,10.789 cw(c0,0) 7.171,10.789 17.627,3.839 cw(c15.075,0) 17.627,-3.839 7.171,-10.789 cw(c0,0) -7.171,-10.789 -17.627,-3.839
3D body "TEXAS_LMF (O–MBCY–W8).stp": height 7.62, standoff -6, extent -19.639,-12.955 19.64,12.955

## TEXAS_SMP-TPS7A1633-MVK [mm] "Modular And Versatile Reference Kit (MAVRK) TPS7A1633 Low-Dropout Linear Regulator (LDO) Submodule"
height 5.39
pads (12):
  round 1.9 hole 1.2: CON1-1(-6.35,6.35) CON1-2(-6.35,3.81) CON1-3(-6.35,1.27) CON1-4(-6.35,-1.27) CON1-5(-6.35,-3.81) CON1-6(-6.35,-6.35) CON2-1(6.35,6.35) CON2-2(6.35,3.81) CON2-3(6.35,1.27) CON2-4(6.35,-1.27) CON2-5(6.35,-3.81) CON2-6(6.35,-6.35)
Top Overlay:
  circle w0.2: c0.615,0.472 r0.3
  lines w0.2: -2.016,3.408 -0.666,3.408 ; -2.016,4.508 -0.666,4.508 ; -2.014,-0.815 -0.664,-0.815 ; -2.014,0.285 -0.664,0.285 ; -0.366,-3.267 -0.366,-2.317 ; 0.465,-0.084 0.465,-1.034 0.765,-1.034 0.765,-0.084 ; 0.465,2.916 0.465,3.866 0.765,3.866 0.765,2.916 ; 0.484,-3.267 0.484,-2.317 ; 1.115,-0.084 1.115,-1.034 1.415,-1.034 1.415,-0.084 ; 1.115,2.916 1.115,3.866 1.415,3.866 1.415,2.916 ; 1.366,-4.126 2.316,-4.126 ; 1.366,-3.276 2.316,-3.276 ; 1.765,-0.084 1.765,-1.034 2.065,-1.034 2.065,-0.084 ; 1.765,2.916 1.765,3.866 2.065,3.866 2.065,2.916 ; 2.415,-0.084 2.415,-1.034 2.715,-1.034 2.715,-0.084 ; 2.415,2.916 2.415,3.866 2.715,3.866 2.715,2.916 ; -8.89,-8.89 -8.89,8.89 8.89,8.89 8.89,-8.89 -8.89,-8.89 ; -2.016,3.008 ccw(c-1.916,3.008) -1.916,2.908 -0.766,2.908 ccw(c-0.766,3.008) -0.666,3.008 -0.666,4.908 ccw(c-0.766,4.908) -0.766,5.008 -1.916,5.008 ccw(c-1.916,4.908) -2.016,4.908 -2.016,3.008 ; -2.014,-1.215 ccw(c-1.914,-1.215) -1.914,-1.315 -0.764,-1.315 ccw(c-0.764,-1.215) -0.664,-1.215 -0.664,0.685 ccw(c-0.764,0.685) -0.764,0.785 -1.914,0.785 ccw(c-1.914,0.685) -2.014,0.685 -2.014,-1.215 ; -0.816,-3.267 -0.816,-2.317 0.934,-2.317 0.934,-3.267 -0.816,-3.267 ; 0.115,-0.084 3.065,-0.084 3.065,2.916 0.115,2.916 0.115,-0.084 ; 1.366,-4.576 1.366,-2.826 2.316,-2.826 2.316,-4.576 1.366,-4.576
  text "CON1-1" at -8.533,7.702 h0.8
  text "CON2-1" at 4.334,7.702 h0.8
Notvisible:
  circle w0.1: c-6.35,6.35 r0.45
  circle w0.1: c-6.35,6.35 r0.8
  circle w0.1: c6.35,6.35 r0.45
  circle w0.1: c6.35,6.35 r0.8
  circle w0.1: c-6.35,3.81 r0.45
  circle w0.1: c-6.35,3.81 r0.8
  circle w0.1: c6.35,3.81 r0.45
  circle w0.1: c6.35,3.81 r0.8
  circle w0.1: c-6.35,1.27 r0.45
  circle w0.1: c-6.35,1.27 r0.8
  circle w0.1: c6.35,1.27 r0.45
  circle w0.1: c6.35,1.27 r0.8
  circle w0.1: c-6.35,-1.27 r0.45
  circle w0.1: c-6.35,-1.27 r0.8
  circle w0.1: c6.35,-1.27 r0.45
  circle w0.1: c6.35,-1.27 r0.8
  circle w0.1: c-6.35,-3.81 r0.45
  circle w0.1: c-6.35,-3.81 r0.8
  circle w0.1: c6.35,-3.81 r0.45
  circle w0.1: c6.35,-3.81 r0.8
  circle w0.1: c-6.35,-6.35 r0.45
  circle w0.1: c-6.35,-6.35 r0.8
  circle w0.1: c6.35,-6.35 r0.45
  circle w0.1: c6.35,-6.35 r0.8
  lines w0.05: -0.5,0 0,0 ; 0,-0.5 0,0 ; 0,0.5 0,0 ; 0.5,0 0,0
  lines w0.1: -6.85,-6.35 -6.35,-6.35 ; -6.85,-3.81 -6.35,-3.81 ; -6.85,-1.27 -6.35,-1.27 ; -6.85,1.27 -6.35,1.27 ; -6.85,3.81 -6.35,3.81 ; -6.85,6.35 -6.35,6.35 ; -6.35,-6.85 -6.35,-6.35 ; -6.35,-5.85 -6.35,-6.35 ; -6.35,-4.31 -6.35,-3.81 ; -6.35,-3.31 -6.35,-3.81 ; -6.35,-1.77 -6.35,-1.27 ; -6.35,-0.77 -6.35,-1.27 ; -6.35,0.77 -6.35,1.27 ; -6.35,1.77 -6.35,1.27 ; -6.35,3.31 -6.35,3.81 ; -6.35,4.31 -6.35,3.81 ; -6.35,5.85 -6.35,6.35 ; -6.35,6.85 -6.35,6.35 ; -5.85,-6.35 -6.35,-6.35 ; -5.85,-3.81 -6.35,-3.81 ; -5.85,-1.27 -6.35,-1.27 ; -5.85,1.27 -6.35,1.27 ; -5.85,3.81 -6.35,3.81 ; -5.85,6.35 -6.35,6.35 ; 5.85,-6.35 6.35,-6.35 ; 5.85,-3.81 6.35,-3.81 ; 5.85,-1.27 6.35,-1.27 ; 5.85,1.27 6.35,1.27 ; 5.85,3.81 6.35,3.81 ; 5.85,6.35 6.35,6.35 ; 6.35,-6.85 6.35,-6.35 ; 6.35,-5.85 6.35,-6.35 ; 6.35,-4.31 6.35,-3.81 ; 6.35,-3.31 6.35,-3.81 ; 6.35,-1.77 6.35,-1.27 ; 6.35,-0.77 6.35,-1.27 ; 6.35,0.77 6.35,1.27 ; 6.35,1.77 6.35,1.27 ; 6.35,3.31 6.35,3.81 ; 6.35,4.31 6.35,3.81 ; 6.35,5.85 6.35,6.35 ; 6.35,6.85 6.35,6.35 ; 6.85,-6.35 6.35,-6.35 ; 6.85,-3.81 6.35,-3.81 ; 6.85,-1.27 6.35,-1.27 ; 6.85,1.27 6.35,1.27 ; 6.85,3.81 6.35,3.81 ; 6.85,6.35 6.35,6.35
Mechanical 14:
  circle w0.1: c6.35,-3.81 r0.45
  circle w0.1: c6.35,-3.81 r0.8
  circle w0.1: c6.35,-1.27 r0.45
  circle w0.1: c6.35,-1.27 r0.8
  circle w0.1: c6.35,3.81 r0.45
  circle w0.1: c-6.35,-3.81 r0.45
  circle w0.1: c-6.35,-3.81 r0.8
  circle w0.1: c-6.35,1.27 r0.45
  circle w0.1: c-6.35,1.27 r0.8
  circle w0.1: c-6.35,3.81 r0.45
  circle w0.1: c-6.35,3.81 r0.8
  circle w0.1: c-6.35,6.35 r0.45
  circle w0.1: c-6.35,6.35 r0.8
  circle w0.1: c-6.35,-6.35 r0.45
  circle w0.1: c-6.35,-6.35 r0.8
  circle w0.1: c-6.35,-1.27 r0.45
  circle w0.1: c-6.35,-1.27 r0.8
  circle w0.1: c6.35,6.35 r0.45
  circle w0.1: c6.35,6.35 r0.8
  circle w0.1: c6.35,1.27 r0.45
  circle w0.1: c6.35,1.27 r0.8
  circle w0.1: c6.35,-6.35 r0.45
  circle w0.1: c6.35,3.81 r0.8
  circle w0.1: c6.35,-6.35 r0.8
  circle w0.1: c0.615,0.472 r0.3
  lines w0.1: -2.016,3.408 -0.666,3.408 ; -2.016,4.508 -0.666,4.508 ; -2.014,-0.815 -0.664,-0.815 ; -2.014,0.285 -0.664,0.285 ; -0.366,-3.267 -0.366,-2.317 ; 0.465,-0.084 0.465,-1.034 0.765,-1.034 0.765,-0.084 ; 0.465,2.916 0.465,3.866 0.765,3.866 0.765,2.916 ; 0.484,-3.267 0.484,-2.317 ; 1.115,-0.084 1.115,-1.034 1.415,-1.034 1.415,-0.084 ; 1.115,2.916 1.115,3.866 1.415,3.866 1.415,2.916 ; 1.366,-4.126 2.316,-4.126 ; 1.366,-3.276 2.316,-3.276 ; 1.765,-0.084 1.765,-1.034 2.065,-1.034 2.065,-0.084 ; 1.765,2.916 1.765,3.866 2.065,3.866 2.065,2.916 ; 2.415,-0.084 2.415,-1.034 2.715,-1.034 2.715,-0.084 ; 2.415,2.916 2.415,3.866 2.715,3.866 2.715,2.916 ; -8.89,-8.89 -8.89,8.89 8.89,8.89 8.89,-8.89 -8.89,-8.89 ; -6.667,-6.667 -6.667,-6.032 -6.032,-6.032 -6.032,-6.667 -6.667,-6.667 ; -6.667,-4.127 -6.032,-4.127 -6.032,-3.492 -6.667,-3.492 -6.667,-4.127 ; -6.667,-1.587 -6.032,-1.587 -6.032,-0.953 -6.667,-0.953 -6.667,-1.587 ; -6.667,0.953 -6.667,1.587 -6.032,1.587 -6.032,0.953 -6.667,0.953 ; -6.667,3.492 -6.032,3.492 -6.032,4.127 -6.667,4.127 -6.667,3.492 ; -6.667,6.032 -6.032,6.032 -6.032,6.667 -6.667,6.667 -6.667,6.032 ; -2.016,3.008 ccw(c-1.916,3.008) -1.916,2.908 -0.766,2.908 ccw(c-0.766,3.008) -0.666,3.008 -0.666,4.908 ccw(c-0.766,4.908) -0.766,5.008 -1.916,5.008 ccw(c-1.916,4.908) -2.016,4.908 -2.016,3.008 ; -2.014,-1.215 ccw(c-1.914,-1.215) -1.914,-1.315 -0.764,-1.315 ccw(c-0.764,-1.215) -0.664,-1.215 -0.664,0.685 ccw(c-0.764,0.685) -0.764,0.785 -1.914,0.785 ccw(c-1.914,0.685) -2.014,0.685 -2.014,-1.215 ; -0.816,-3.267 -0.816,-2.317 0.934,-2.317 0.934,-3.267 -0.816,-3.267 ; 0.115,-0.084 3.065,-0.084 3.065,2.916 0.115,2.916 0.115,-0.084 ; 1.366,-4.576 1.366,-2.826 2.316,-2.826 2.316,-4.576 1.366,-4.576 ; 6.032,-6.667 6.032,-6.032 6.667,-6.032 6.667,-6.667 6.032,-6.667 ; 6.032,-4.127 6.667,-4.127 6.667,-3.492 6.032,-3.492 6.032,-4.127 ; 6.032,-1.587 6.667,-1.587 6.667,-0.953 6.032,-0.953 6.032,-1.587 ; 6.032,0.953 6.667,0.953 6.667,1.587 6.032,1.587 6.032,0.953 ; 6.032,3.492 6.667,3.492 6.667,4.127 6.032,4.127 6.032,3.492 ; 6.032,6.032 6.667,6.032 6.667,6.667 6.032,6.667 6.032,6.032
  text "CON1-1" at -8.533,7.702 h0.8
  text "CON2-1" at 4.334,7.702 h0.8
3D body "TEXAS_SMP-TPS7A1633-MVK.stp": height 5.39, standoff -5.84, extent -8.89,-8.89 8.89,8.89

## TGS 2620 [mm] "4 Leads Solvent Vapors Sensor, Body Dia. 9.2mm, Body Height 7.8mm, Lead Spacing Diameter 5.1mm"
height 8.3
pads (4):
  round 2 hole 1.3: 1(-1.8,1.806) 2(-1.8,-1.806) 3(1.8,-1.806) 4(1.8,1.806)
Top Overlay:
  circle w0.2: c0,0 r4.7
  lines w0.2: -0.25,4.693 -0.25,5.2 0.25,5.2 0.25,4.693
Notvisible:
  lines w0.1: -2.3,-1.806 -1.8,-1.806 ; -2.3,1.806 -1.8,1.806 ; -1.8,-2.306 -1.8,-1.806 ; -1.8,-1.306 -1.8,-1.806 ; -1.8,1.306 -1.8,1.806 ; -1.8,2.306 -1.8,1.806 ; -1.3,-1.806 -1.8,-1.806 ; -1.3,1.806 -1.8,1.806 ; -0.5,0 0,0 ; 0,-0.5 0,0 ; 0,0.5 0,0 ; 0.5,0 0,0 ; 1.3,-1.806 1.8,-1.806 ; 1.3,1.806 1.8,1.806 ; 1.8,-2.306 1.8,-1.806 ; 1.8,-1.306 1.8,-1.806 ; 1.8,1.306 1.8,1.806 ; 1.8,2.306 1.8,1.806 ; 2.3,-1.806 1.8,-1.806 ; 2.3,1.806 1.8,1.806
Mechanical 14:
  circle w0.1: c0,0 r2
  circle w0.1: c0,0 r4.7
  lines w0.1: -0.25,4.693 -0.25,5.2 0.25,5.2 0.25,4.693
3D body "TGS 2620.stp": height 9.3, standoff -3.6, extent -4.7,-4.694 4.7,5.2

## TO-3 [mm] "TO-204 (TO-3) Case"
height 8.51
pads (4):
  round 2.1 hole 1.4: 1(-1.815,5.46) 2(-1.815,-5.46)
  round 8.2 hole 4.2: 3(-15.075,0) 3(15.075,0)
Top Overlay:
  circle w0.2: c0,0 r10.54
  lines w0.2: -17.785,-3.925 cw(c-15.075,0) -17.765,3.939 -7.576,10.974 cw(c0,0) 7.576,10.974 17.765,3.939 cw(c15.075,0) 17.765,-3.939 7.576,-10.974 cw(c0,0) -7.576,-10.974 -17.785,-3.925
Notvisible:
  circle w0.1: c-1.815,5.46 r0.575
  circle w0.1: c-1.815,-5.46 r0.575
  lines w0.1: -15.575,0 -15.075,0 ; -15.075,-0.5 -15.075,0 ; -15.075,0.5 -15.075,0 ; -14.575,0 -15.075,0 ; -2.315,-5.46 -1.815,-5.46 ; -2.315,5.46 -1.815,5.46 ; -1.815,-5.96 -1.815,-5.46 ; -1.815,-4.96 -1.815,-5.46 ; -1.815,4.96 -1.815,5.46 ; -1.815,5.96 -1.815,5.46 ; -1.315,-5.46 -1.815,-5.46 ; -1.315,5.46 -1.815,5.46 ; -0.5,0 0,0 ; 0,-0.5 0,0 ; 0,0.5 0,0 ; 0.5,0 0,0 ; 14.575,0 15.075,0 ; 15.075,-0.5 15.075,0 ; 15.075,0.5 15.075,0 ; 15.575,0 15.075,0
Mechanical 14:
  circle w0.1: c15.075,0 r1.95
  circle w0.1: c15.075,0 r2.095
  circle w0.1: c-15.075,0 r2.095
  circle w0.1: c0,0 r10.54
  lines w0.1: -17.785,-3.925 cw(c-15.075,0) -17.765,3.939 -7.576,10.974 cw(c0,0) 7.576,10.974 17.765,3.939 cw(c15.075,0) 17.765,-3.939 7.576,-10.974 cw(c0,0) -7.576,-10.974 -17.785,-3.925
3D body "TO-3.stp": height 8.51, standoff -12.19, extent -19.845,-13.335 19.845,13.335

## TO-5-3 [mm] "TO-5, 3 Leads"
height 11.25
pads (3):
  round 1.5 hole 0.8: 1(0,2.54) 2(-2.54,0) 3(0,-2.54)
Top Overlay:
  circle w0.2: c0,0 r4.25
  lines w0.2: 2.99,3.626 ccw(c0,0) 3.626,2.99 4.278,3.642 3.642,4.278 2.99,3.626
Notvisible:
  lines w0.1: -3.04,0 -2.54,0 ; -2.54,-0.5 -2.54,0 ; -2.54,0.5 -2.54,0 ; -2.04,0 -2.54,0 ; -0.5,-2.54 0,-2.54 ; -0.5,0 0,0 ; -0.5,2.54 0,2.54 ; 0,-3.04 0,-2.54 ; 0,-2.04 0,-2.54 ; 0,-0.5 0,0 ; 0,0.5 0,0 ; 0,2.04 0,2.54 ; 0,3.04 0,2.54 ; 0.5,-2.54 0,-2.54 ; 0.5,0 0,0 ; 0.5,2.54 0,2.54
Mechanical 14:
  circle w0.1: c0,0 r4.25
  lines w0.1: 2.99,3.626 ccw(c0,0) 3.626,2.99 4.278,3.642 3.642,4.278 2.99,3.626
3D body "TO-5-3.stp": height 11.25, standoff -3.65, extent -4.7,-4.699 4.7,4.699

## TO-5-4 [mm] "TO-5, 4 Leads"
height 11.25
pads (4):
  round 1.5 hole 0.8: 1(0,2.54) 2(-2.54,0) 3(0,-2.54) 4(2.54,0)
Top Overlay:
  circle w0.2: c0,0 r4.25
  lines w0.2: 2.99,3.626 ccw(c0,0) 3.626,2.99 4.278,3.642 3.642,4.278 2.99,3.626
Notvisible:
  lines w0.1: -3.04,0 -2.54,0 ; -2.54,-0.5 -2.54,0 ; -2.54,0.5 -2.54,0 ; -2.04,0 -2.54,0 ; -0.5,-2.54 0,-2.54 ; -0.5,0 0,0 ; -0.5,2.54 0,2.54 ; 0,-3.04 0,-2.54 ; 0,-2.04 0,-2.54 ; 0,-0.5 0,0 ; 0,0.5 0,0 ; 0,2.04 0,2.54 ; 0,3.04 0,2.54 ; 0.5,-2.54 0,-2.54 ; 0.5,0 0,0 ; 0.5,2.54 0,2.54
Mechanical 14:
  circle w0.1: c0,0 r4.25
  lines w0.1: 2.99,3.626 ccw(c0,0) 3.626,2.99 4.278,3.642 3.642,4.278 2.99,3.626
3D body "TO-5-4.stp": height 11.25, standoff -3.65, extent -4.7,-4.699 4.7,4.699

## TO-18 [mm] "TO-18  3 Leads, Pitch 2.54mm, Body Dia. 5.84mm, Leads Dia. 0.5mm"
height 10.13
pads (3):
  round 1.4 hole 0.8: 1(0,1.27) 2(-1.27,0) 3(0,-1.27)
Top Overlay:
  circle w0.2: c0,0 r2.47
  lines w0.2: 1.593,2.447 ccw(c0,0) 2.447,1.593 3.282,2.428 2.428,3.282 1.593,2.447
Mechanical 14:
  circle w0.1: c0,0 r2.47
  lines w0.1: 1.593,2.447 ccw(c0,0) 2.447,1.593 3.282,2.428 2.428,3.282 1.593,2.447
3D body "TO-18.stp": height 10.13, standoff -3.6, extent -2.92,-2.92 3.282,3.282

## TO-39 [mm] "TO-39  3 Leads, Pitch 2.54mm, Body Dia. 9.4mm, Leads Dia. 0.5mm"
height 6.6
pads (3):
  round 1.3 hole 0.8: 1(0,2.54) 2(-2.54,0) 3(0,-2.54)
Top Overlay:
  circle w0.2: c0,0 r4.25
  lines w0.2: 2.99,3.626 ccw(c0,0) 3.626,2.99 4.278,3.642 3.642,4.278 2.99,3.626
Notvisible:
  lines w0.1: -3.04,0 -2.54,0 ; -2.54,-0.5 -2.54,0 ; -2.54,0.5 -2.54,0 ; -2.04,0 -2.54,0 ; -0.5,-2.54 0,-2.54 ; -0.5,0 0,0 ; -0.5,2.54 0,2.54 ; 0,-3.04 0,-2.54 ; 0,-2.04 0,-2.54 ; 0,-0.5 0,0 ; 0,0.5 0,0 ; 0,2.04 0,2.54 ; 0,3.04 0,2.54 ; 0.5,-2.54 0,-2.54 ; 0.5,0 0,0 ; 0.5,2.54 0,2.54
Mechanical 14:
  circle w0.1: c0,0 r4.25
  lines w0.1: 2.99,3.626 ccw(c0,0) 3.626,2.99 4.278,3.642 3.642,4.278 2.99,3.626
3D body "TO-39.stp": height 11.25, standoff -3.65, extent -4.7,-4.7 4.7,4.7

## TO-46-4 [mm] "JEDEC TO-48, 4 Leads"
height 3.93
pads (4):
  round 1.5 hole 0.8: 1(0,1.27) 2(-1.27,0) 3(0,-1.27) 4(1.27,0)
Top Overlay:
  circle w0.2: c0,0 r2.782
  lines w0.2: 1.563,2.299 2.277,3.013 3.013,2.277 2.299,1.563
Notvisible:
  circle w0.1: c1.27,0 r0.4
  circle w0.1: c0,-1.27 r0.4
  circle w0.1: c-1.27,0 r0.4
  circle w0.1: c0,1.27 r0.4
  circle w0.1: c0,-1.27 r0.75
  circle w0.1: c-1.27,0 r0.75
  circle w0.1: c0,1.27 r0.75
  lines w0.1: -1.77,0 -1.27,0 ; -1.27,-0.5 -1.27,0 ; -1.27,0.5 -1.27,0 ; -0.77,0 -1.27,0 ; -0.5,-1.27 0,-1.27 ; -0.5,0 0,0 ; -0.5,1.27 0,1.27 ; 0,-1.77 0,-1.27 ; 0,-0.77 0,-1.27 ; 0,-0.5 0,0 ; 0,0.5 0,0 ; 0,0.77 0,1.27 ; 0,1.77 0,1.27 ; 0.5,-1.27 0,-1.27 ; 0.5,0 0,0 ; 0.5,1.27 0,1.27 ; 0.77,0 1.27,0 ; 1.27,-0.5 1.27,0 ; 1.27,0.5 1.27,0 ; 1.77,0 1.27,0
Mechanical 14:
  circle w0.1: c0,0 r2.782
  lines w0.1: 1.563,2.299 2.277,3.013 3.013,2.277 2.299,1.563
3D body "TO-46-4.stp": height 3.94, standoff -3.6, extent -2.777,-2.78 3.013,3.013